# Altium footprint library Inductor.PcbLib: 75 footprints (part 2 of 5)
Each footprint in its own frame and in the unit in brackets; x right, y up, seen from the top. Pads: shape width x height; smd on the part's side, far side on the other; paste and mask are expansions set on the pad; w line width, h text height; cw(c..) or ccw(c..) is an arc to the next point about the centre after c.
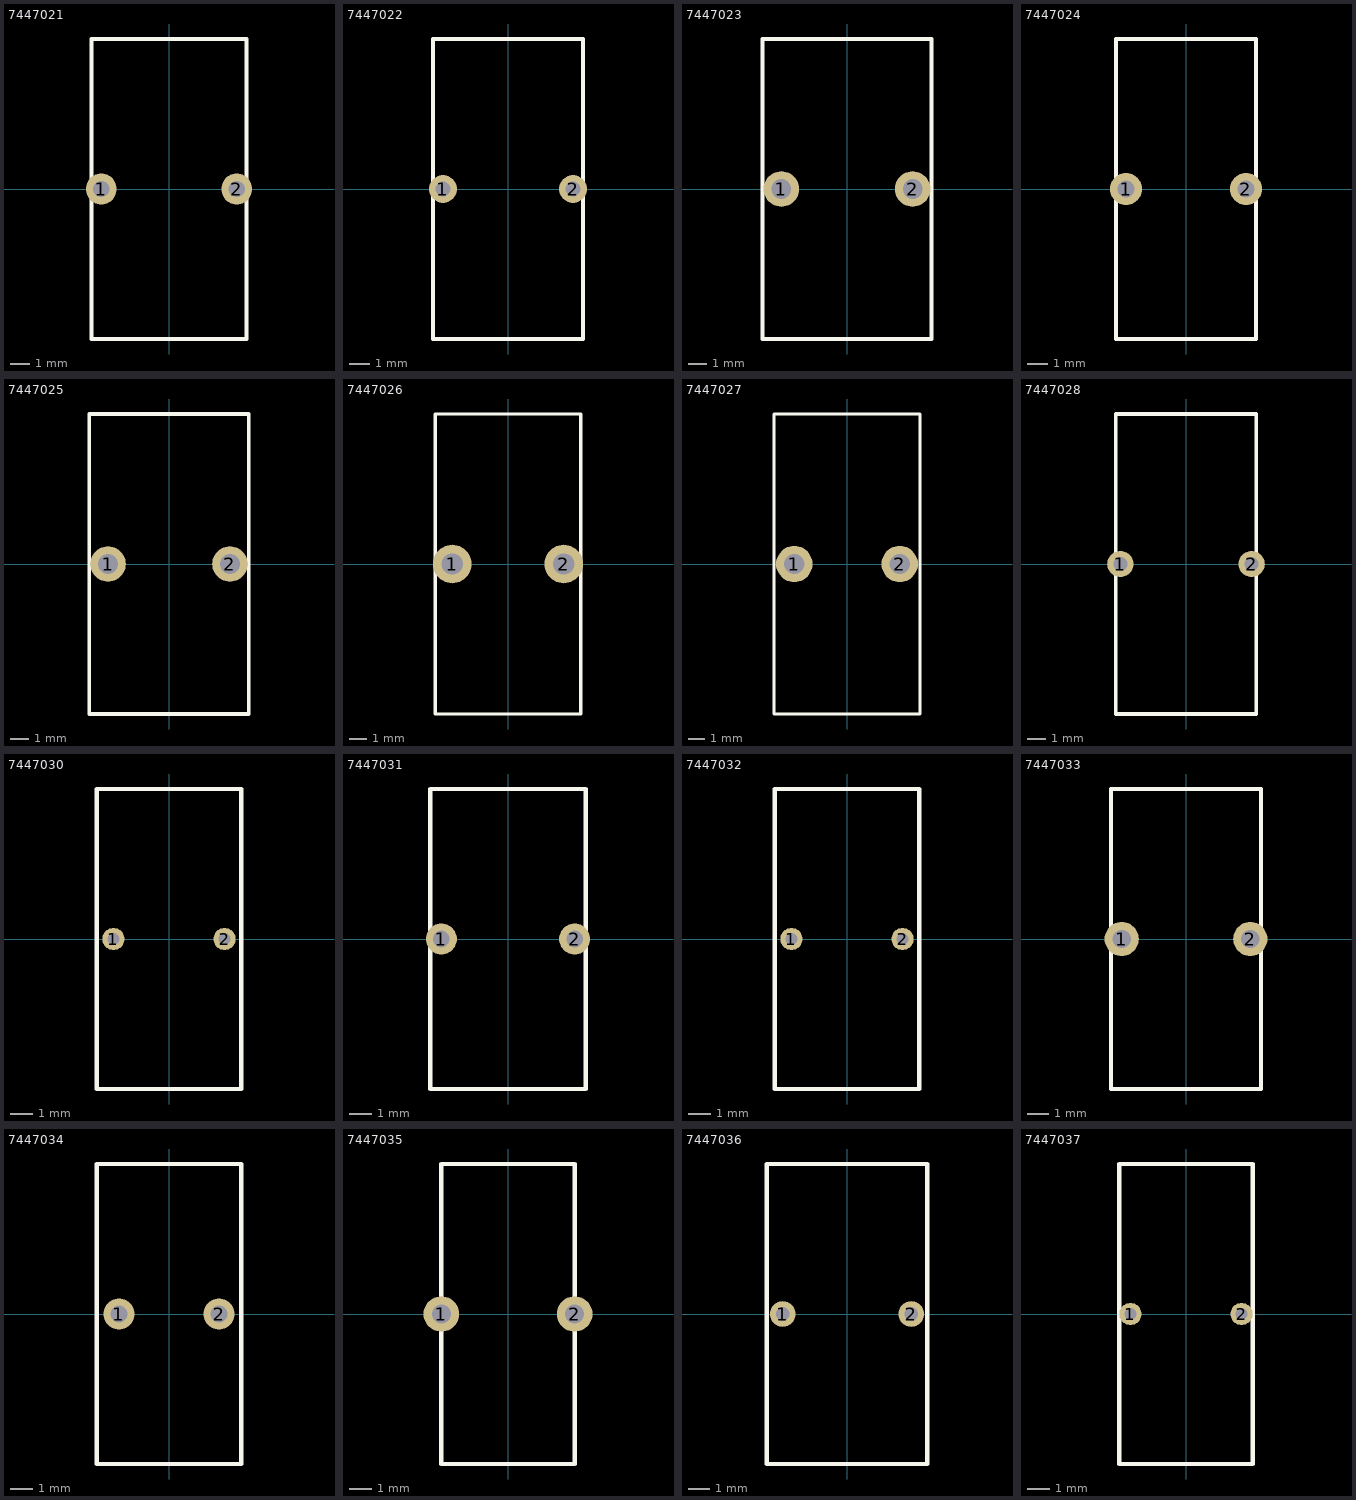
[diagram p1: the footprints below, top view; thin cyan lines are the x and y axes]

## 7447021 [mm] "Body 15.5x8mm, 2 leads"
height 15.5
pads (2):
  round 1.6 hole 0.85: 1(-3.5,0) 2(3.5,0)
Top Overlay:
  lines w0.2: -4,-7.75 -4,7.75 4,7.75 4,-7.75 -4,-7.75
3D body "7447021.stp": height 16.84, standoff -14.25, extent -4.62,-8.363 4.62,8.362

## 7447022 [mm] "Body 15x7.5mm, 2 leads"
height 15
pads (2):
  round 1.4 hole 0.75: 1(-3.25,0) 2(3.25,0)
Top Overlay:
  lines w0.2: -3.75,-7.5 -3.75,7.5 3.75,7.5 3.75,-7.5 -3.75,-7.5
3D body "7447022.stp": height 16.55, standoff -14, extent -4.32,-8.065 4.32,8.066

## 7447023 [mm] "Body 16x9mm, 2 leads"
height 16
pads (2):
  round 1.9 hole 1.05: 1(-3.5,0) 2(3.5,0)
Top Overlay:
  lines w0.2: -4.5,-8 -4.5,8 4.5,8 4.5,-8 -4.5,-8
3D body "7447023.stp": height 17.28, standoff -14.5, extent -5.32,-8.81 5.32,8.807

## 7447024 [mm] "Body 15x7mm, 2 leads"
height 15
pads (2):
  round 1.6 hole 0.85: 1(-3,0) 2(3,0)
Top Overlay:
  lines w0.2: -3.5,-7.5 -3.5,7.5 3.5,7.5 3.5,-7.5 -3.5,-7.5
3D body "7447024.stp": height 16.59, standoff -14, extent -4.12,-8.113 4.12,8.113

## 7447025 [mm] "Body 16x8.5mm, 2 leads"
height 16
pads (2):
  round 1.9 hole 1.05: 1(-3.25,0) 2(3.25,0)
Top Overlay:
  lines w0.2: -4.25,-8 -4.25,8 4.25,8 4.25,-8 -4.25,-8
3D body "7447025.stp": height 18.28, standoff -13.5, extent -5.07,-8.81 5.07,8.807

## 7447026 [mm] "Body 17.5x8.5mm, 2 leads"
height 17.5
pads (2):
  round 2.25 hole 1.25: 1(-3.25,0) 2(3.25,0)
Top Overlay:
  lines w0.2: -4.25,-8.75 -4.25,8.75 4.25,8.75 4.25,-8.75 -4.25,-8.75
3D body "7447026.stp": height 19.18, standoff -6.75, extent -5.27,-9.748 5.27,9.747

## 7447027 [mm] "Body 18.5x9mm, 2 leads"
height 18.5
pads (2):
  round 2.25 hole 1.25: 1(-3.25,0) 2(3.25,0)
Top Overlay:
  lines w0.2: -4.5,-9.25 4.5,-9.25 4.5,9.25 -4.5,9.25 -4.5,-9.25
3D body "7447027.stp": height 20.68, standoff -6.25, extent -5.52,-10.247 5.52,10.247

## 7447028 [mm] "Body 16x7.5mm, 2 leads"
height 16
pads (2):
  round 1.4 hole 0.75: 1(-3.5,0) 2(3.5,0)
Top Overlay:
  lines w0.2: -3.75,-8 -3.75,8 3.75,8 3.75,-8 -3.75,-8
3D body "7447028.stp": height 17.55, standoff -19, extent -4.32,-8.566 4.32,8.566

## 7447030 [mm] "Body 13.5x6.5mm, 2 leads"
height 13.5
pads (2):
  round 1 hole 0.55: 1(-2.5,0) 2(2.5,0)
Top Overlay:
  lines w0.2: -3.25,-6.75 -3.25,6.75 3.25,6.75 3.25,-6.75 -3.25,-6.75
3D body "7447030.stp": height 14.31, standoff -14, extent -3.32,-6.816 3.32,6.816

## 7447031 [mm] "Body 13.5x7mm, 2 leads"
height 13.5
pads (2):
  round 1.4 hole 0.75: 1(-3,0) 2(3,0)
Top Overlay:
  lines w0.2: -3.5,-6.75 -3.5,6.75 3.5,6.75 3.5,-6.75 -3.5,-6.75
3D body "7447031.stp": height 14.74, standoff -14.25, extent -4.01,-7.254 4.01,7.253

## 7447032 [mm] "Body 13.5x6.5mm, 2 leads"
height 13.5
pads (2):
  round 1 hole 0.55: 1(-2.5,0) 2(2.5,0)
Top Overlay:
  lines w0.2: -3.25,-6.75 -3.25,6.75 3.25,6.75 3.25,-6.75 -3.25,-6.75
3D body "7447032.stp": height 13.81, standoff -14.5, extent -3.07,-6.816 3.07,6.816

## 7447033 [mm] "Body 14x7mm, 2 leads"
height 14
pads (2):
  round 1.6 hole 0.85: 1(-3,0) 2(3,0)
Top Overlay:
  lines w0.2: -3.5,-7 -3.5,7 3.5,7 3.5,-7 -3.5,-7
3D body "7447033.stp": height 15.6, standoff -14, extent -4.12,-7.613 4.12,7.614

## 7447034 [mm] "Body 13.5x6.5mm, 2 leads"
height 13.5
pads (2):
  round 1.4 hole 0.75: 1(-2.25,0) 2(2.25,0)
Top Overlay:
  lines w0.2: -3.25,-6.75 3.25,-6.75 3.25,6.75 -3.25,6.75 -3.25,-6.75
3D body "7447034.stp": height 14.49, standoff -14, extent -3.76,-7.004 3.76,7.003

## 7447035 [mm] "Body 13.5x6mm, 2 leads"
height 13.5
pads (2):
  round 1.6 hole 0.85: 1(-3,0) 2(3,0)
Top Overlay:
  lines w0.2: -3,-6.75 -3,6.75 3,6.75 3,-6.75 -3,-6.75
3D body "7447035.stp": height 14.8, standoff -14.25, extent -3.62,-7.352 3.62,7.351

## 7447036 [mm] "Body 14x7.5mm, 2 leads"
height 14
pads (2):
  round 1.2 hole 0.65: 1(-3,0) 2(3,0)
Top Overlay:
  lines w0.2: -3.75,-7 3.75,-7 3.75,7 -3.75,7 -3.75,-7
3D body "7447036.stp": height 14.91, standoff -14.5, extent -4.17,-7.416 4.17,7.417

## 7447037 [mm] "Body 13.5x6mm, 2 leads"
height 13.5
pads (2):
  round 1 hole 0.55: 1(-2.5,0) 2(2.5,0)
Top Overlay:
  lines w0.2: -3,-6.75 -3,6.75 3,6.75 3,-6.75 -3,-6.75
3D body "7447037.stp": height 14.56, standoff -14.25, extent -3.32,-7.066 3.32,7.067